# Altium footprint library devices.PCBLIB: 335 footprints (part 20 of 21)
Each footprint in its own frame and in the unit in brackets; x right, y up, seen from the top. Pads: shape width x height; smd on the part's side, far side on the other; paste and mask are expansions set on the pad; w line width, h text height; cw(c..) or ccw(c..) is an arc to the next point about the centre after c.
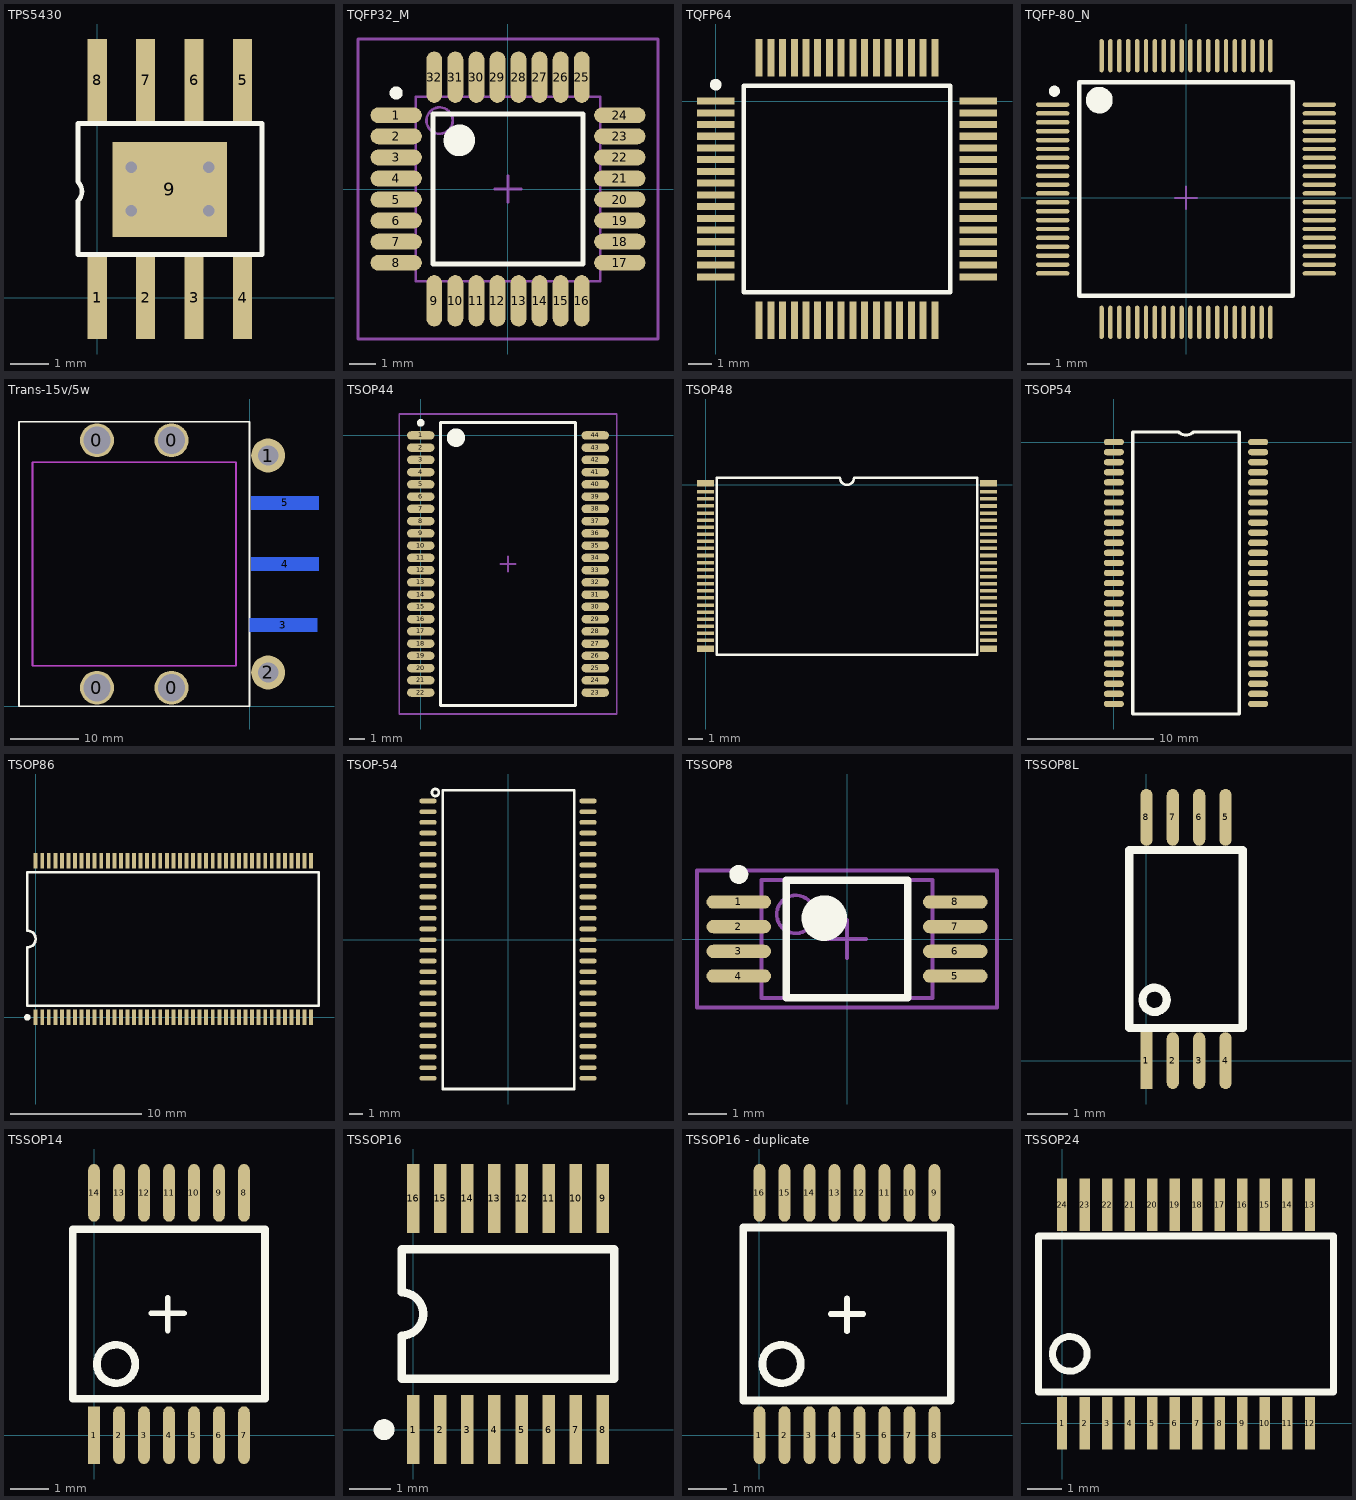
[diagram p19: the footprints below, top view; thin cyan lines are the x and y axes]

## TPS5430 [mm]
pads (9):
  rect 0.5x2.15 smd: 1(0,0) 2(1.27,0) 3(2.54,0) 4(3.81,0) 5(3.81,5.715) 6(2.54,5.715) 7(1.27,5.715) 8(0,5.715)
  rect 3x2.49 smd: 9(1.905,2.85)
via 0.889,3.429 diameter 0.508 hole 0.305
via 0.889,2.286 diameter 0.508 hole 0.305
via 2.921,3.429 diameter 0.508 hole 0.305
via 2.921,2.286 diameter 0.508 hole 0.305
Top Overlay:
  lines w0.127: -0.508,1.143 4.318,1.143 4.318,4.572 -0.508,4.572 -0.508,3.048 cw(c-0.762,2.794) -0.508,2.54 -0.508,1.143

## TQFP32_M [mm] "32-Pin Thin Quad Flat Pack 0.8 mm Pitch, IPC Low Density"
height 1.6
pads (32):
  oval 1.95x0.6 smd: 1(-4.25,2.8) 2(-4.25,2) 3(-4.25,1.2) 4(-4.25,0.4) 5(-4.25,-0.4) 6(-4.25,-1.2) 7(-4.25,-2) 8(-4.25,-2.8) 17(4.25,-2.8) 18(4.25,-2) 19(4.25,-1.2) 20(4.25,-0.4) 21(4.25,0.4) 22(4.25,1.2) 23(4.25,2) 24(4.25,2.8)
  oval 0.6x1.95 smd: 9(-2.8,-4.25) 10(-2,-4.25) 11(-1.2,-4.25) 12(-0.4,-4.25) 13(0.4,-4.25) 14(1.2,-4.25) 15(2,-4.25) 16(2.8,-4.25) 25(2.8,4.25) 26(2,4.25) 27(1.2,4.25) 28(0.4,4.25) 29(-0.4,4.25) 30(-1.2,4.25) 31(-2,4.25) 32(-2.8,4.25)
Top Overlay:
  circle w0.25: c-4.25,3.65 r0.125
  circle w0.6: c-1.85,1.85 r0.3
  lines w0.2: -2.85,-2.85 -2.85,2.85 2.85,2.85 2.85,-2.85 -2.85,-2.85
Mechanical 13:
  circle w0.1: c-2.6,2.6 r0.5
  lines w0.1: -3.5,-3.5 -3.5,3.5 3.5,3.5 3.5,-3.5 -3.5,-3.5
Mechanical 15:
  lines w0.1: -0.5,0 0.5,0 ; 0,-0.5 0,0.5 ; -5.7,-5.7 -5.7,5.7 5.7,5.7 5.7,-5.7 -5.7,-5.7
3D body: height 1.6, standoff 0, extent -3.5,-3.5 3.5,3.5

## TQFP64 [mm] "QFP, Thin; 64 Leads; Body 10 x 10 mm; Pitch 0.5 mm"
height 1.6
pads (64):
  rect 1.6x0.3 smd: 1(0,0) 2(0,-0.5) 3(0,-1) 4(0,-1.5) 5(0,-2) 6(0,-2.5) 7(0,-3) 8(0,-3.5) 9(0,-4) 10(0,-4.5) 11(0,-5) 12(0,-5.5) 13(0,-6) 14(0,-6.5) 15(0,-7) 16(0,-7.5) 33(11.2,-7.5) 34(11.2,-7) 35(11.2,-6.5) 36(11.2,-6) 37(11.2,-5.5) 38(11.2,-5) 39(11.2,-4.5) 40(11.2,-4) 41(11.2,-3.5) 42(11.2,-3) 43(11.2,-2.5) 44(11.2,-2) 45(11.2,-1.5) 46(11.2,-1) 47(11.2,-0.5) 48(11.2,0)
  rect 0.3x1.6 smd: 17(1.85,-9.35) 18(2.35,-9.35) 19(2.85,-9.35) 20(3.35,-9.35) 21(3.85,-9.35) 22(4.35,-9.35) 23(4.85,-9.35) 24(5.35,-9.35) 25(5.85,-9.35) 26(6.35,-9.35) 27(6.85,-9.35) 28(7.35,-9.35) 29(7.85,-9.35) 30(8.35,-9.35) 31(8.85,-9.35) 32(9.35,-9.35) 49(9.35,1.85) 50(8.85,1.85) 51(8.35,1.85) 52(7.85,1.85) 53(7.35,1.85) 54(6.85,1.85) 55(6.35,1.85) 56(5.85,1.85) 57(5.35,1.85) 58(4.85,1.85) 59(4.35,1.85) 60(3.85,1.85) 61(3.35,1.85) 62(2.85,1.85) 63(2.35,1.85) 64(1.85,1.85)
Top Overlay:
  circle w0.25: c0,0.7 r0.125
  lines w0.2: 1.2,-8.15 10,-8.15 10,0.65 1.2,0.65 1.2,-8.15

## TQFP-80_N [mm] "80-Pin Thin Plastic Quad Flat Pack 0.5 mm Pitch, 1.0/0.1 mm Lead Form, IPC Medium Density"
height 1.2
pads (80):
  oval 1.5x0.2 smd: 1(-6,4.2) 2(-6,3.8) 3(-6,3.4) 4(-6,3) 5(-6,2.6) 6(-6,2.2) 7(-6,1.8) 8(-6,1.4) 9(-6,1) 10(-6,0.6) 11(-6,0.2) 12(-6,-0.2) 13(-6,-0.6) 14(-6,-1) 15(-6,-1.4) 16(-6,-1.8) 17(-6,-2.2) 18(-6,-2.6) 19(-6,-3) 20(-6,-3.4) 41(6,-3.4) 42(6,-3) 43(6,-2.6) 44(6,-2.2) 45(6,-1.8) 46(6,-1.4) 47(6,-1) 48(6,-0.6) 49(6,-0.2) 50(6,0.2) 51(6,0.6) 52(6,1) 53(6,1.4) 54(6,1.8) 55(6,2.2) 56(6,2.6) 57(6,3) 58(6,3.4) 59(6,3.8) 60(6,4.2)
  oval 0.2x1.5 smd: 21(-3.8,-5.6) 22(-3.4,-5.6) 23(-3,-5.6) 24(-2.6,-5.6) 25(-2.2,-5.6) 26(-1.8,-5.6) 27(-1.4,-5.6) 28(-1,-5.6) 29(-0.6,-5.6) 30(-0.2,-5.6) 31(0.2,-5.6) 32(0.6,-5.6) 33(1,-5.6) 34(1.4,-5.6) 35(1.8,-5.6) 36(2.2,-5.6) 37(2.6,-5.6) 38(3,-5.6) 39(3.4,-5.6) 40(3.8,-5.6) 61(3.8,6.4) 62(3.4,6.4) 63(3,6.4) 64(2.6,6.4) 65(2.2,6.4) 66(1.8,6.4) 67(1.4,6.4) 68(1,6.4) 69(0.6,6.4) 70(0.2,6.4) 71(-0.2,6.4) 72(-0.6,6.4) 73(-1,6.4) 74(-1.4,6.4) 75(-1.8,6.4) 76(-2.2,6.4) 77(-2.6,6.4) 78(-3,6.4) 79(-3.4,6.4) 80(-3.8,6.4)
Top Overlay:
  circle w0.25: c-5.925,4.8 r0.125
  circle w0.6: c-3.9,4.4 r0.3
  lines w0.2: -4.8,-4.4 -4.8,5.2 4.8,5.2 4.8,-4.4 -4.8,-4.4
Mechanical 15:
  lines w0.1: -0.5,0 0.5,0 ; 0,-0.5 0,0.5

## Trans-15v/5w [mm]
pads (9):
  round 5 hole 4: 0(-22.5,2.75) 0(-22.5,39.25) 0(-11.5,2.75) 0(-11.5,39.25)
  round 5 hole 3: 1(2.75,37) 2(2.75,5)
  rect 10x2 smd far side: 3(5,12) 4(5.25,21) 5(5.25,30)
Top Overlay:
  lines w0.254: -34,0 0,0 0,42 -34,42 -34,0
Keep-Out Layer:
  lines w0.254: -32,6 -32,36 -2,36 -2,6 -32,6
Mechanical 1:
  lines w0.254: -32,6 -2,6 -2,36 -32,36 -32,6

## TSOP44 [mm] "SOP, 44-Leads, Body 18.4x10.16mm, Pitch 0.8mm, IPC Low Density"
height 1.2
pads (44):
  oval 1.8x0.55 smd: 1(-0.005,-0.012) 2(-0.005,-0.812) 3(-0.005,-1.612) 4(-0.005,-2.412) 5(-0.005,-3.212) 6(-0.005,-4.012) 7(-0.005,-4.812) 8(-0.005,-5.612) 9(-0.005,-6.412) 10(-0.005,-7.212) 11(-0.005,-8.012) 12(-0.005,-8.812) 13(-0.005,-9.612) 14(-0.005,-10.412) 15(-0.005,-11.212) 16(-0.005,-12.012) 17(-0.005,-12.812) 18(-0.005,-13.612) 19(-0.005,-14.412) 20(-0.005,-15.212) 21(-0.005,-16.012) 22(-0.005,-16.812) 23(11.395,-16.812) 24(11.395,-16.012) 25(11.395,-15.212) 26(11.395,-14.412) 27(11.395,-13.612) 28(11.395,-12.812) 29(11.395,-12.012) 30(11.395,-11.212) 31(11.395,-10.412) 32(11.395,-9.612) 33(11.395,-8.812) 34(11.395,-8.012) 35(11.395,-7.212) 36(11.395,-6.412) 37(11.395,-5.612) 38(11.395,-4.812) 39(11.395,-4.012) 40(11.395,-3.212) 41(11.395,-2.412) 42(11.395,-1.612) 43(11.395,-0.812) 44(11.395,-0.012)
Top Overlay:
  circle w0.6: c2.295,-0.162 r0.3
  circle w0.25: c-0.005,0.813 r0.125
  lines w0.2: 1.295,-17.662 10.095,-17.662 10.095,0.838 1.295,0.838 1.295,-17.662
Mechanical 15:
  lines w0.1: 5.195,-8.412 6.195,-8.412 ; 5.695,-8.912 5.695,-7.912 ; -1.405,-18.212 12.795,-18.212 12.795,1.388 -1.405,1.388 -1.405,-18.212

## TSOP48 [mm]
pads (48):
  rect 1.2x0.45 smd: 1(-0.021,0.108) 24(-0.021,-11.592) 25(19.979,-11.592) 48(19.979,0.108)
  rect 1.2x0.25 smd: 2(-0.021,-0.492) 3(-0.021,-0.992) 4(-0.021,-1.492) 5(-0.021,-1.992) 6(-0.021,-2.492) 7(-0.021,-2.992) 8(-0.021,-3.492) 9(-0.021,-3.992) 10(-0.021,-4.492) 11(-0.021,-4.992) 12(-0.021,-5.492) 13(-0.021,-5.992) 14(-0.021,-6.492) 15(-0.021,-6.992) 16(-0.021,-7.492) 17(-0.021,-7.992) 18(-0.021,-8.492) 19(-0.021,-8.992) 20(-0.021,-9.492) 21(-0.021,-9.992) 22(-0.021,-10.492) 23(-0.021,-10.992) 26(19.979,-10.992) 27(19.979,-10.492) 28(19.979,-9.992) 29(19.979,-9.492) 30(19.979,-8.992) 31(19.979,-8.492) 32(19.979,-7.992) 33(19.979,-7.492) 34(19.979,-6.992) 35(19.979,-6.492) 36(19.979,-5.992) 37(19.979,-5.492) 38(19.979,-4.992) 39(19.979,-4.492) 40(19.979,-3.992) 41(19.979,-3.492) 42(19.979,-2.992) 43(19.979,-2.492) 44(19.979,-1.992) 45(19.979,-1.492) 46(19.979,-0.992) 47(19.979,-0.492)
Top Overlay:
  lines w0.178: 0.779,-11.992 19.179,-11.992 19.179,0.508 10.479,0.508 cw(c9.979,0.508) 9.479,0.508 0.779,0.508 0.779,-11.992

## TSOP54 [mm]
pads (54):
  oval 1.6x0.5 smd: 1(-0.009,0.009) 2(-0.009,-0.791) 3(-0.009,-1.591) 4(-0.009,-2.391) 5(-0.009,-3.191) 6(-0.009,-3.991) 7(-0.009,-4.791) 8(-0.009,-5.591) 9(-0.009,-6.391) 10(-0.009,-7.191) 11(-0.009,-7.991) 12(-0.009,-8.791) 13(-0.009,-9.591) 14(-0.009,-10.391) 15(-0.009,-11.191) 16(-0.009,-11.991) 17(-0.009,-12.791) 18(-0.009,-13.591) 19(-0.009,-14.391) 20(-0.009,-15.191) 21(-0.009,-15.991) 22(-0.009,-16.791) 23(-0.009,-17.591) 24(-0.009,-18.391) 25(-0.009,-19.191) 26(-0.009,-19.991) 27(-0.009,-20.791) 28(11.451,-20.791) 29(11.451,-19.991) 30(11.451,-19.191) 31(11.451,-18.391) 32(11.451,-17.591) 33(11.451,-16.791) 34(11.451,-15.991) 35(11.451,-15.191) 36(11.451,-14.391) 37(11.451,-13.591) 38(11.451,-12.791) 39(11.451,-11.991) 40(11.451,-11.191) 41(11.451,-10.391) 42(11.451,-9.591) 43(11.451,-8.791) 44(11.451,-7.991) 45(11.451,-7.191) 46(11.451,-6.391) 47(11.451,-5.591) 48(11.451,-4.791) 49(11.451,-3.991) 50(11.451,-3.191) 51(11.451,-2.391) 52(11.451,-1.591) 53(11.451,-0.791) 54(11.451,0.009)
Top Overlay:
  lines w0.254: 1.491,-21.591 1.491,0.809 5.13,0.809 ccw(c5.721,1.4) 6.312,0.809 9.951,0.809 9.951,-21.591 1.491,-21.591

## TSOP86 [mm] "Shrink Small Outline, Plastic, Thin; 40 Leads; Body Width 18.4 mm; Pitch 0.5 mm"
height 1.2
pads (86):
  rect 0.3x1.2 smd: 1(0,0) 2(0.5,0) 3(1,0) 4(1.5,0) 5(2,0) 6(2.5,0) 7(3,0) 8(3.5,0) 9(4,0) 10(4.5,0) 11(5,0) 12(5.5,0) 13(6,0) 14(6.5,0) 15(7,0) 16(7.5,0) 17(8,0) 18(8.5,0) 19(9,0) 20(9.5,0) 21(10,0) 22(10.5,0) 23(11,0) 24(11.5,0) 25(12,0) 26(12.5,0) 27(13,0) 28(13.5,0) 29(14,0) 30(14.5,0) 31(15,0) 32(15.5,0) 33(16,0) 34(16.5,0) 35(17,0) 36(17.5,0) 37(18,0) 38(18.5,0) 39(19,0) 40(19.5,0) 41(20,0) 42(20.5,0) 43(21,0) 44(21,11.938) 45(20.5,11.938) 46(20,11.938) 47(19.5,11.938) 48(19,11.938) 49(18.5,11.938) 50(18,11.938) 51(17.5,11.938) 52(17,11.938) 53(16.5,11.938) 54(16,11.938) 55(15.5,11.938) 56(15,11.938) 57(14.5,11.938) 58(14,11.938) 59(13.5,11.938) 60(13,11.938) 61(12.5,11.938) 62(12,11.938) 63(11.5,11.938) 64(11,11.938) 65(10.5,11.938) 66(10,11.938) 67(9.5,11.938) 68(9,11.938) 69(8.5,11.938) 70(8,11.938) 71(7.5,11.938) 72(7,11.938) 73(6.5,11.938) 74(6,11.938) 75(5.5,11.938) 76(5,11.938) 77(4.5,11.938) 78(4,11.938) 79(3.5,11.938) 80(3,11.938) 81(2.5,11.938) 82(2,11.938) 83(1.5,11.938) 84(1,11.938) 85(0.5,11.938) 86(0,11.938)
Top Overlay:
  circle w0.25: c-0.633,0 r0.125
  lines w0.2: -0.635,0.889 -0.635,5.334 ccw(c-0.635,5.969) -0.635,6.604 -0.635,11.049 21.59,11.049 21.59,0.889 -0.635,0.889

## TSOP-54 [mm]
pads (54):
  oval 1.3x0.35 smd: 1(-6,10.4) 2(-6,9.6) 3(-6,8.8) 4(-6,8) 5(-6,7.2) 6(-6,6.4) 7(-6,5.6) 8(-6,4.8) 9(-6,4) 10(-6,3.2) 11(-6,2.4) 12(-6,1.6) 13(-6,0.8) 14(-6,0) 15(-6,-0.8) 16(-6,-1.6) 17(-6,-2.4) 18(-6,-3.2) 19(-6,-4) 20(-6,-4.8) 21(-6,-5.6) 22(-6,-6.4) 23(-6,-7.2) 24(-6,-8) 25(-6,-8.8) 26(-6,-9.6) 27(-6,-10.4) 28(6,-10.4) 29(6,-9.6) 30(6,-8.8) 31(6,-8) 32(6,-7.2) 33(6,-6.4) 34(6,-5.6) 35(6,-4.8) 36(6,-4) 37(6,-3.2) 38(6,-2.4) 39(6,-1.6) 40(6,-0.8) 41(6,0) 42(6,0.8) 43(6,1.6) 44(6,2.4) 45(6,3.2) 46(6,4) 47(6,4.8) 48(6,5.6) 49(6,6.4) 50(6,7.2) 51(6,8) 52(6,8.8) 53(6,9.6) 54(6,10.4)
Top Overlay:
  circle w0.2: c-5.45,11.04 r0.262
  lines w0.2: -4.9,-11.2 4.96,-11.2 4.96,11.2 -4.9,11.2 -4.9,-11.2

## TSSOP8 [mm] "TSOP, 8-Leads, Body 3x4.4mm, Pitch 0.65mm, IPC Medium Density"
height 1.2
pads (8):
  oval 1.7x0.35 smd: 1(-2.85,0.975) 2(-2.85,0.325) 3(-2.85,-0.325) 4(-2.85,-0.975) 5(2.85,-0.975) 6(2.85,-0.325) 7(2.85,0.325) 8(2.85,0.975)
Top Overlay:
  circle w0.6: c-0.6,0.55 r0.3
  circle w0.25: c-2.85,1.7 r0.125
  lines w0.2: -1.6,-1.55 1.6,-1.55 1.6,1.55 -1.6,1.55 -1.6,-1.55
Mechanical 13:
  circle w0.1: c-1.35,0.65 r0.5
  lines w0.1: -2.25,-1.55 2.25,-1.55 2.25,1.55 -2.25,1.55 -2.25,-1.55
Mechanical 15:
  lines w0.1: -0.5,0 0.5,0 ; 0,-0.5 0,0.5 ; -3.95,-1.8 3.95,-1.8 3.95,1.8 -3.95,1.8 -3.95,-1.8
3D body: height 1.2, standoff 0, extent -2.25,-1.55 2.25,1.55

## TSSOP8L [mm]
pads (8):
  rect 0.3x1.4 smd: 1(0,0)
  oval 0.3x1.4 smd: 2(0.65,0) 3(1.3,0) 4(1.95,0) 5(1.95,6) 6(1.3,6) 7(0.65,6) 8(0,6)
Top Overlay:
  circle w0.2: c0.2,1.5 r0.3
  lines w0.2: -0.425,0.8 2.375,0.8 2.375,5.2 -0.425,5.2 -0.425,0.8

## TSSOP14 [mm]
pads (14):
  rect 0.3x1.5 smd: 1(0,0)
  oval 0.3x1.5 smd: 2(0.65,0) 3(1.3,0) 4(1.95,0) 5(2.6,0) 6(3.25,0) 7(3.9,0) 8(3.9,6.3) 9(3.25,6.3) 10(2.6,6.3) 11(1.95,6.3) 12(1.3,6.3) 13(0.65,6.3) 14(0,6.3)
Top Overlay:
  circle w0.2: c0.575,1.85 r0.5
  lines w0.15: 1.49,3.17 2.34,3.17 ; 1.915,2.72 1.915,3.57
  lines w0.2: -0.555,0.95 4.445,0.95 4.445,5.35 -0.555,5.35 -0.555,0.95

## TSSOP16 [mm]
pads (16):
  rect 0.3x1.65 smd: 1(0,0) 2(0.65,0) 3(1.3,0) 4(1.95,0) 5(2.6,0) 6(3.25,0) 7(3.9,0) 8(4.55,0) 9(4.55,5.55) 10(3.9,5.55) 11(3.25,5.55) 12(2.6,5.55) 13(1.95,5.55) 14(1.3,5.55) 15(0.65,5.55) 16(0,5.55)
Top Overlay:
  circle w0.25: c-0.7,0 r0.125
  lines w0.2: -0.275,1.225 -0.275,2.258 ccw(c-0.275,2.775) -0.275,3.292 -0.275,4.325 4.825,4.325 4.825,1.225 -0.275,1.225

## TSSOP16 - duplicate [mm]
pads (16):
  oval 0.3x1.5 smd: 1(0,0) 2(0.65,0) 3(1.3,0) 4(1.95,0) 5(2.6,0) 6(3.25,0) 7(3.9,0) 8(4.55,0) 9(4.55,6.3) 10(3.9,6.3) 11(3.25,6.3) 12(2.6,6.3) 13(1.95,6.3) 14(1.3,6.3) 15(0.65,6.3) 16(0,6.3)
Top Overlay:
  circle w0.2: c0.575,1.85 r0.5
  lines w0.15: 1.85,3.15 2.7,3.15 ; 2.275,2.7 2.275,3.55
  lines w0.2: -0.425,0.9 4.975,0.9 4.975,5.4 -0.425,5.4 -0.425,0.9

## TSSOP24 [mm]
pads (24):
  rect 0.3x1.5 smd: 1(0,0) 2(0.65,0) 3(1.3,0) 4(1.95,0) 5(2.6,0) 6(3.25,0) 7(3.9,0) 8(4.55,0) 9(5.2,0) 10(5.85,0) 11(6.5,0) 12(7.15,0) 13(7.15,6.3) 14(6.5,6.3) 15(5.85,6.3) 16(5.2,6.3) 17(4.55,6.3) 18(3.9,6.3) 19(3.25,6.3) 20(2.6,6.3) 21(1.95,6.3) 22(1.3,6.3) 23(0.65,6.3) 24(0,6.3)
Top Overlay:
  circle w0.2: c0.225,2 r0.5
  lines w0.2: -0.675,0.9 -0.675,5.4 7.825,5.4 7.825,0.9 -0.675,0.9